# Altium footprint library chipfc_libs.PCBLIB: 337 footprints (part 11 of 22)
Each footprint in its own frame and in the unit in brackets; x right, y up, seen from the top. Pads: shape width x height; smd on the part's side, far side on the other; paste and mask are expansions set on the pad; w line width, h text height; cw(c..) or ccw(c..) is an arc to the next point about the centre after c.
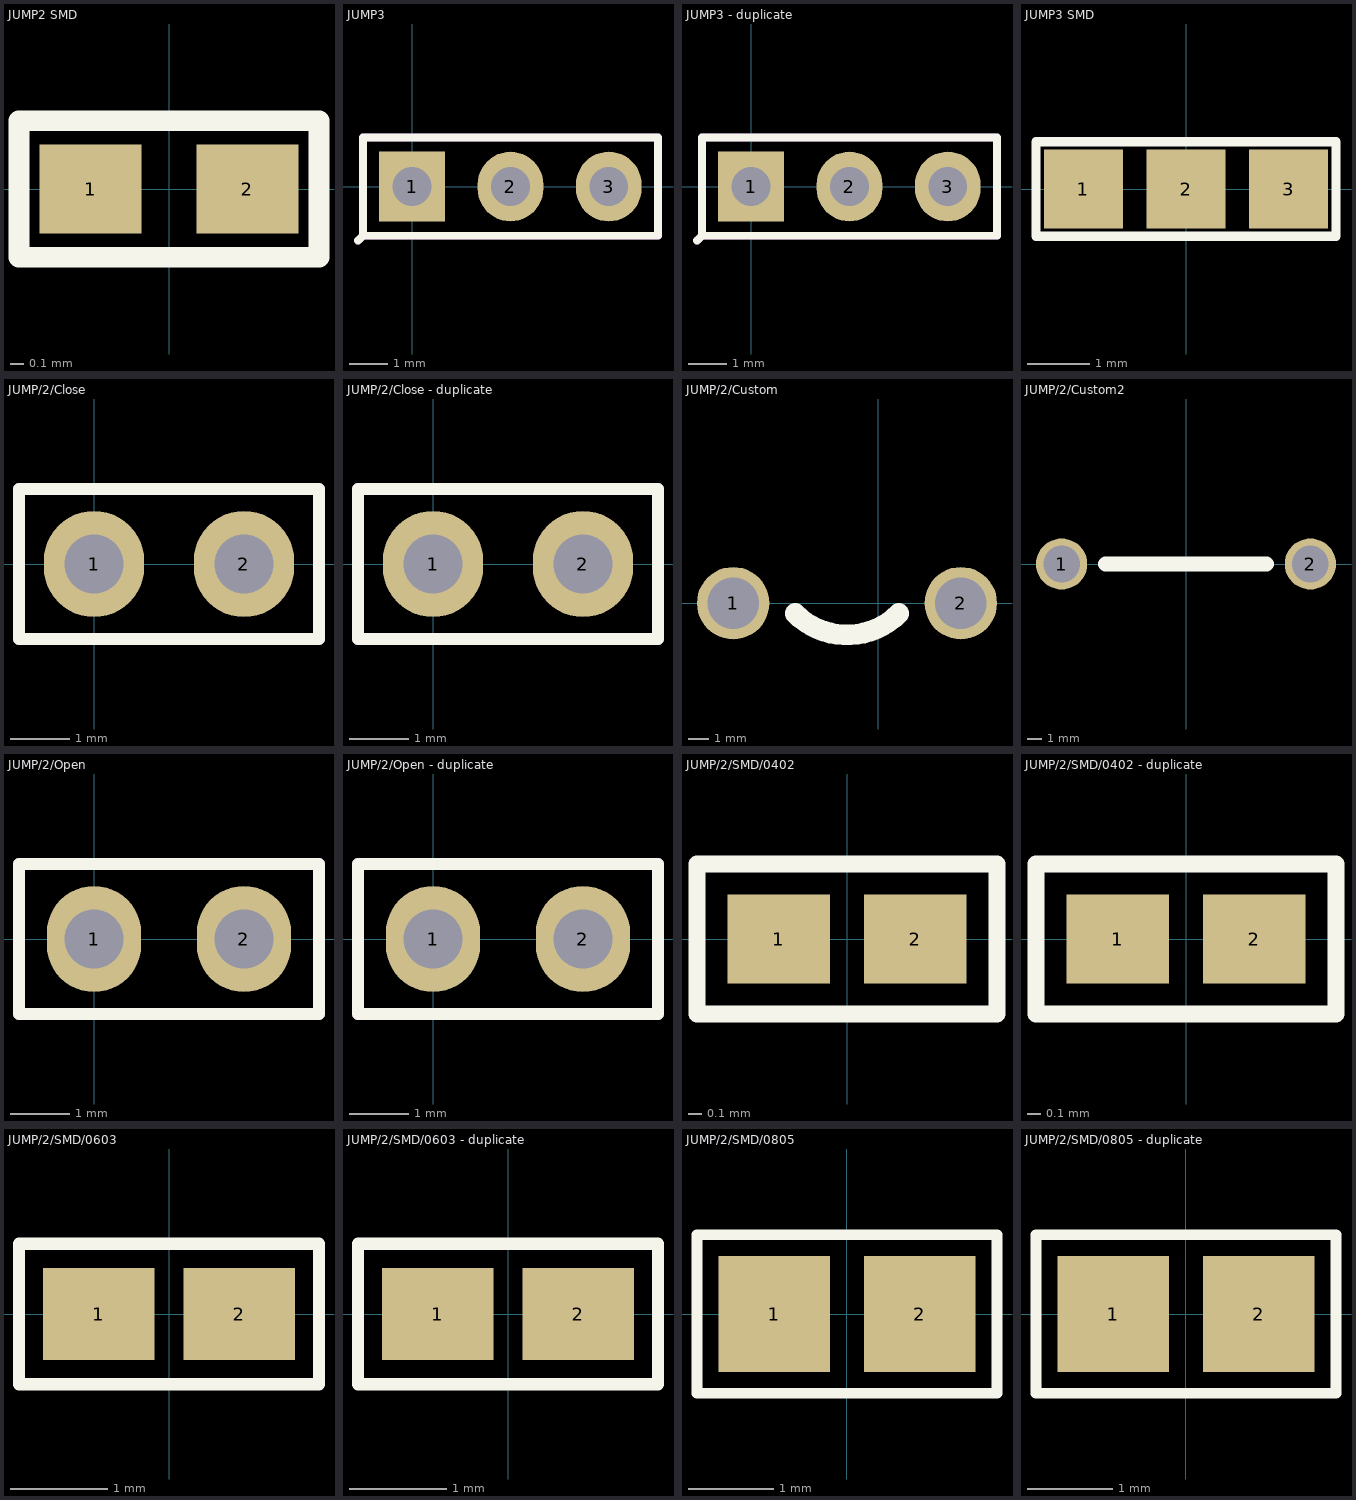
[diagram p10: the footprints below, top view; thin cyan lines are the x and y axes]

## JUMP2 SMD [mm]
pads (2):
  rect 0.75x0.65 smd: 1(-0.575,0) 2(0.575,0)
Top Overlay:
  lines w0.152: -1.1,-0.5 1.1,-0.5 1.1,0.5 -1.1,0.5 -1.1,-0.5

## JUMP3 [mm]
pads (3):
  rect 1.7x1.8 hole 1: 1(0,0)
  oval 1.7x1.8 hole 1: 2(2.54,0) 3(5.08,0)
Top Overlay:
  lines w0.203: -1.397,-1.397 -1.27,-1.27 ; -1.27,-1.27 6.35,-1.27 6.35,1.27 -1.27,1.27 -1.27,-1.27
Mechanical 1:
  lines w0.203: -1.397,-1.397 -1.27,-1.27 ; -1.27,-1.27 6.35,-1.27 6.35,1.27 -1.27,1.27 -1.27,-1.27
3D body "User Library-SHORTING JUMPER.step": height 8.54, standoff 2.64, extent -1.27,-1.27 3.81,1.27
3D body "Samtec Header 3pin 2.54mm.STEP": height 8.89, standoff -2.03, extent -1.27,-1.27 6.35,1.27

## JUMP3 - duplicate [mm]
pads (3):
  rect 1.7x1.8 hole 1: 1(0,0)
  oval 1.7x1.8 hole 1: 2(2.54,0) 3(5.08,0)
Top Overlay:
  lines w0.203: -1.397,-1.397 -1.27,-1.27 ; -1.27,-1.27 6.35,-1.27 6.35,1.27 -1.27,1.27 -1.27,-1.27
Mechanical 1:
  lines w0.203: -1.397,-1.397 -1.27,-1.27 ; -1.27,-1.27 6.35,-1.27 6.35,1.27 -1.27,1.27 -1.27,-1.27
3D body "User Library-SHORTING JUMPER.step": height 8.54, standoff 2.64, extent -1.27,-1.27 3.81,1.27
3D body "Samtec Header 3pin 2.54mm.STEP": height 8.89, standoff -2.03, extent -1.27,-1.27 6.35,1.27

## JUMP3 SMD [mil]
pads (3):
  rect 50x50 smd: 1(-65,0) 2(0,0) 3(65,0)
Top Overlay:
  lines w6: -95,-30 -95,30 95,30 95,-30 -95,-30

## JUMP/2/Close [mm]
pads (2):
  oval 1.7x1.8 hole 1: 1(0,0) 2(2.54,0)
Top Overlay:
  lines w0.203: -1.27,-1.27 3.81,-1.27 3.81,1.27 -1.27,1.27 -1.27,-1.27
Mechanical 1:
  lines w0.203: -1.27,-1.27 3.81,-1.27 3.81,1.27 -1.27,1.27 -1.27,-1.27
3D body "User Library-SHORTING JUMPER.step": height 8.54, standoff 2.64, extent -1.27,-1.27 3.81,1.27
3D body "Samtec Header 2pin 2.54mm.STEP": height 8.89, standoff -2.03, extent -1.27,-1.27 3.81,1.27

## JUMP/2/Close - duplicate [mm]
pads (2):
  oval 1.7x1.8 hole 1: 1(0,0) 2(2.54,0)
Top Overlay:
  lines w0.203: -1.27,-1.27 3.81,-1.27 3.81,1.27 -1.27,1.27 -1.27,-1.27
Mechanical 1:
  lines w0.203: -1.27,-1.27 3.81,-1.27 3.81,1.27 -1.27,1.27 -1.27,-1.27
3D body "User Library-SHORTING JUMPER.step": height 8.54, standoff 2.64, extent -1.27,-1.27 3.81,1.27
3D body "Samtec Header 2pin 2.54mm.STEP": height 8.89, standoff -2.03, extent -1.27,-1.27 3.81,1.27

## JUMP/2/Custom [mm]
pads (2):
  round 3.5 hole 2.5: 1(-7,0) 2(4,0)
Top Overlay:
  lines w1: -4,-0.5 ccw(c-1.5,2) 1,-0.5

## JUMP/2/Custom2 [mm]
pads (2):
  round 3.5 hole 2.5: 1(-8.5,0) 2(8.5,0)
Top Overlay:
  lines w1: -5.5,0 5.5,0

## JUMP/2/Open [mm]
pads (2):
  oval 1.6x1.8 hole 1: 1(0,0) 2(2.54,0)
Top Overlay:
  lines w0.203: -1.27,-1.27 3.81,-1.27 3.81,1.27 -1.27,1.27 -1.27,-1.27
Mechanical 1:
  lines w0.203: -1.27,-1.27 3.81,-1.27 3.81,1.27 -1.27,1.27 -1.27,-1.27
3D body "Samtec Header 2pin 2.54mm.STEP": height 8.89, standoff -2.03, extent -1.27,-1.27 3.81,1.27

## JUMP/2/Open - duplicate [mm]
pads (2):
  oval 1.6x1.8 hole 1: 1(0,0) 2(2.54,0)
Top Overlay:
  lines w0.203: -1.27,-1.27 -1.27,1.27 3.81,1.27 3.81,-1.27 -1.27,-1.27
Mechanical 1:
  lines w0.203: -1.27,-1.27 -1.27,1.27 3.81,1.27 3.81,-1.27 -1.27,-1.27
3D body "Samtec Header 2pin 2.54mm.STEP": height 8.89, standoff -2.03, extent -1.27,-1.27 3.81,1.27

## JUMP/2/SMD/0402 [mm]
pads (2):
  rect 0.75x0.65 smd: 1(-0.5,0) 2(0.5,0)
Top Overlay:
  lines w0.127: -1.1,-0.55 1.1,-0.55 1.1,0.55 -1.1,0.55 -1.1,-0.55

## JUMP/2/SMD/0402 - duplicate [mm]
pads (2):
  rect 0.75x0.65 smd: 1(-0.5,0) 2(0.5,0)
Top Overlay:
  lines w0.127: -1.1,-0.55 1.1,-0.55 1.1,0.55 -1.1,0.55 -1.1,-0.55

## JUMP/2/SMD/0603 [mm] "Chip Resistor, 2-Leads, Body 1.6x0.8mm, IPC Medium Density"
height 0.55
pads (2):
  rect 1.15x0.95 smd: 1(-0.725,0) 2(0.725,0)
Top Overlay:
  lines w0.127: -1.55,-0.725 -1.55,0.725 1.55,0.725 1.55,-0.725 -1.55,-0.725

## JUMP/2/SMD/0603 - duplicate [mm] "Chip Resistor, 2-Leads, Body 1.6x0.8mm, IPC Medium Density"
height 0.55
pads (2):
  rect 1.15x0.95 smd: 1(-0.725,0) 2(0.725,0)
Top Overlay:
  lines w0.127: -1.55,-0.725 1.55,-0.725 1.55,0.725 -1.55,0.725 -1.55,-0.725

## JUMP/2/SMD/0805 [mm] "Chip Resistor, 2-Leads, Body 2.0x1.3mm, IPC Medium Density"
height 0.5
pads (2):
  rect 1.3x1.35 smd: 1(-0.85,0) 2(0.85,0)
Top Overlay:
  lines w0.127: -1.75,-0.925 1.75,-0.925 1.75,0.925 -1.75,0.925 -1.75,-0.925

## JUMP/2/SMD/0805 - duplicate [mm] "Chip Resistor, 2-Leads, Body 2.0x1.3mm, IPC Medium Density"
height 0.5
pads (2):
  rect 1.3x1.35 smd: 1(-0.85,0) 2(0.85,0)
Top Overlay:
  lines w0.127: -1.75,-0.925 1.75,-0.925 1.75,0.925 -1.75,0.925 -1.75,-0.925